# Altium footprint library 2.50-TO直插元件封装.PcbLib: 63 footprints (part 3 of 4)
Each footprint in its own frame and in the unit in brackets; x right, y up, seen from the top. Pads: shape width x height; smd on the part's side, far side on the other; paste and mask are expansions set on the pad; w line width, h text height; cw(c..) or ccw(c..) is an arc to the next point about the centre after c.
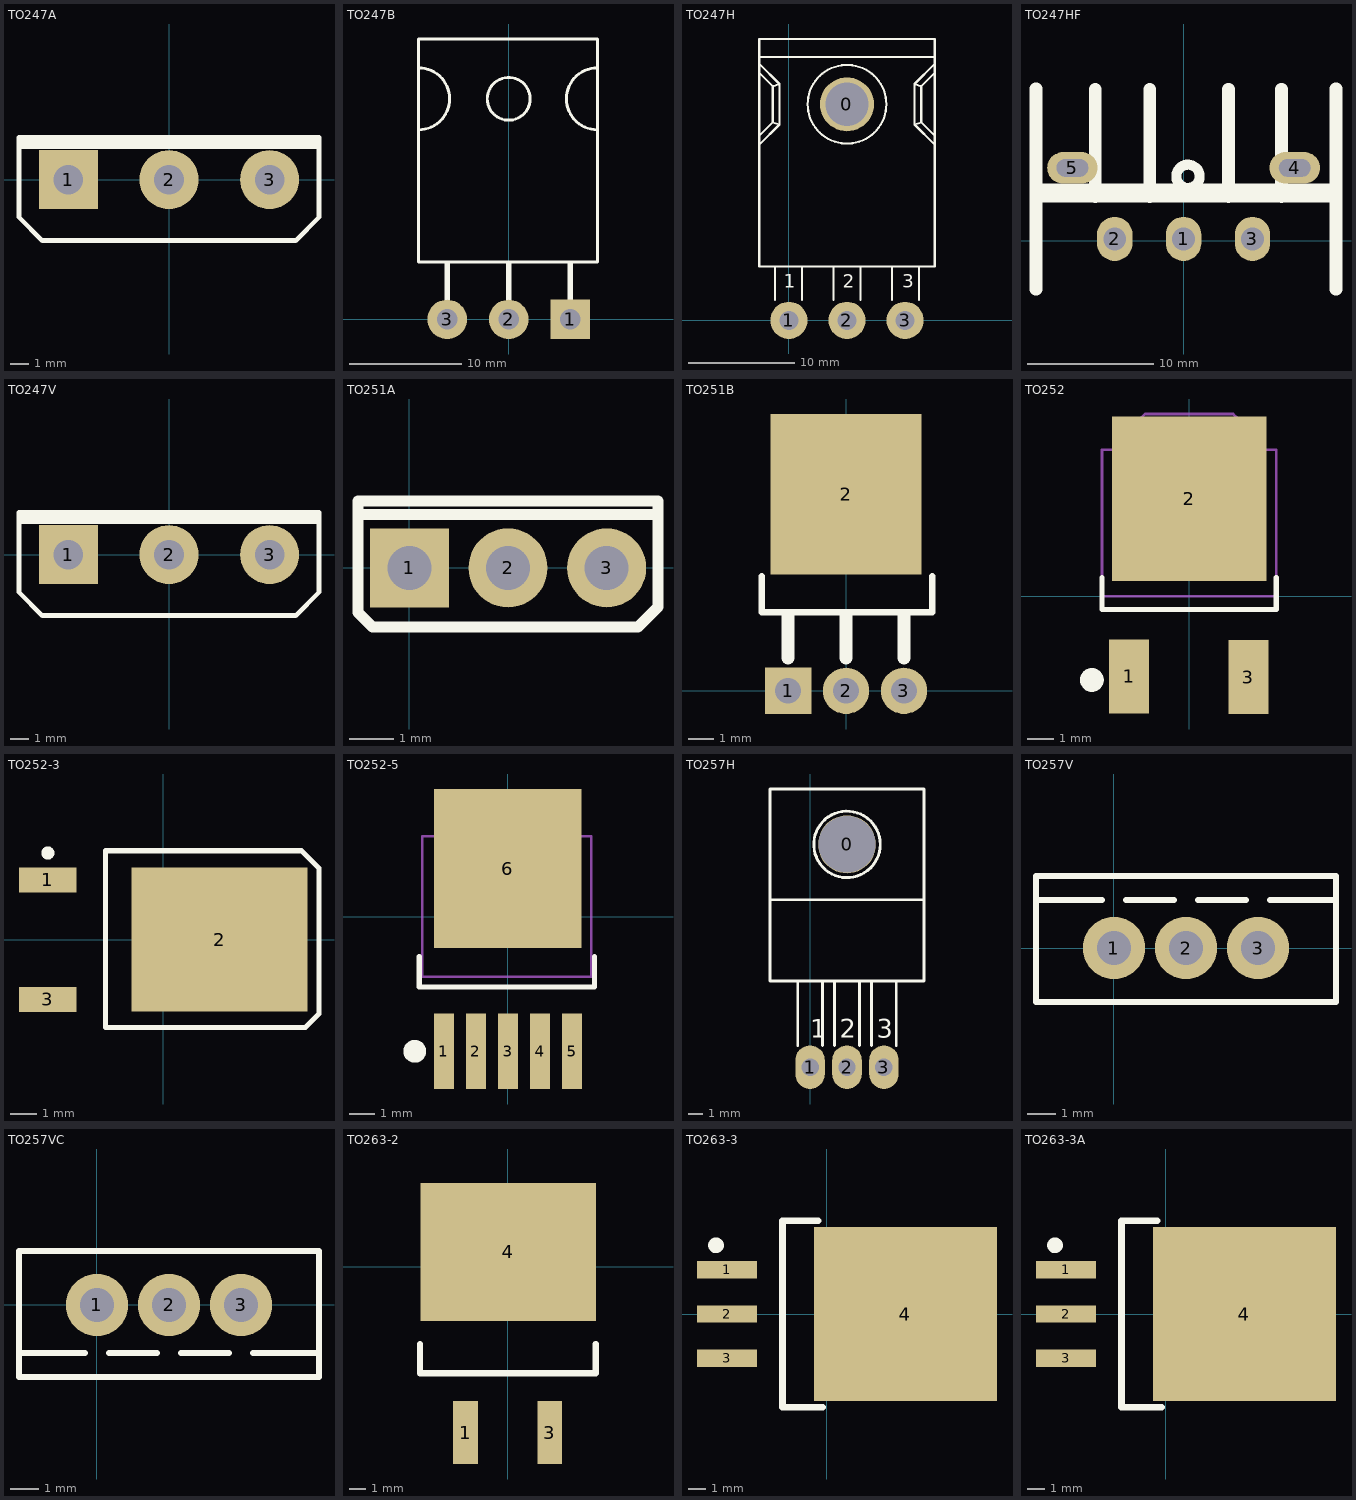
[diagram p2: the footprints below, top view; thin cyan lines are the x and y axes]

## TO247A [mm] "247，3脚立式封装"
pads (3):
  rect 3.2x3.2 hole 1.6: 1(-5.45,0)
  round 3.2 hole 1.6: 2(0,0) 3(5.45,0)
Top Overlay:
  lines w0.254: -8.128,1.778 -8.128,2.032 ; -8.128,1.778 -8.128,-2.032 -6.858,-3.302 6.858,-3.302 8.128,-2.032 8.128,1.778 ; -8.128,1.778 8.128,1.778 ; -8.128,2.032 -8.128,2.286 8.128,2.286 8.128,1.778 ; -8.128,2.032 8.128,2.032 8.128,1.778
3D body: height 24, standoff -6, extent -7.75,-3 7.75,2

## TO247B [mm] "247，3脚卧式封装"
pads (3):
  rect 3.5x3.5 hole 1.8: 1(5.461,0)
  round 3.5 hole 1.8: 2(0,0) 3(-5.461,0)
Top Overlay:
  circle w0.254: c0,19.58 r1.9
  lines w0.254: -8.001,16.83 ccw(c-8.001,19.58) -8.001,22.33 ; 7.874,16.83 cw(c7.874,19.58) 7.874,22.33 ; -8.001,5.08 7.874,5.08 7.874,24.892 -8.001,24.892 -8.001,5.08
  lines w0.508: -5.461,1.397 -5.461,4.953 ; 0,1.397 0,4.953 ; 5.461,1.397 5.461,4.953
3D body: height 3.49, standoff -5.51, extent -7.75,-0.35 7.75,25

## TO247H [mm] "封装库来自淘宝卖家 ID：黄晶宝石"
pads (4):
  round 5.08 hole 4.064: 0(5.461,20.32)
  round 3.5 hole 1.8: 1(0,0) 2(5.461,0) 3(10.922,0)
Top Overlay:
  circle w0.2: c5.461,20.32 r3.698
  lines w0.2: -2.794,16.51 -0.889,18.415 ; -2.794,17.357 -1.524,18.627 ; -2.794,23.283 -1.524,22.013 ; -2.794,24.13 -0.889,22.225 ; -2.794,24.765 13.716,24.765 ; -1.312,1.905 -1.312,5.08 ; 1.228,1.905 1.228,5.08 ; 4.191,1.905 4.191,5.08 ; 6.731,1.905 6.731,5.08 ; 9.694,1.905 9.694,5.08 ; 12.234,1.905 12.234,5.08 ; 13.716,16.51 11.811,18.415 ; 13.716,17.357 12.446,18.627 ; 13.716,23.283 12.446,22.013 ; 13.716,24.13 11.811,22.225 ; -1.524,18.627 -1.524,22.013 ; -1.524,18.627 -0.889,18.415 ; -1.524,22.013 -0.889,22.225 ; -0.889,18.415 -0.889,22.225 ; 11.811,18.415 11.811,22.225 ; 11.811,18.415 12.446,18.627 ; 11.811,22.225 12.446,22.013 ; 12.446,18.627 12.446,22.013 ; -2.794,5.08 13.716,5.08 13.716,26.458 -2.794,26.458 -2.794,5.08
  text "1" at -0.508,3.048 h1.27
  text "2" at 5.08,3.048 h1.27
  text "3" at 10.668,3.048 h1.27
3D body: height 5, standoff -4, extent -2.289,-0.096 13.211,25.254

## TO247HF [mm] "封装库来自淘宝卖家 ID：黄晶宝石"
pads (5):
  oval 2.8x3.5 hole 1.8: 1(0,0.127) 2(-5.45,0.127) 3(5.45,0.127)
  oval 4x2.5 hole 1.4 slot 2.5 at 0 deg: 4(8.8,5.75) 5(-8.8,5.75)
Top Overlay:
  circle w0.8: c0.345,5.08 r0.925
  lines w1: -11.684,-3.849 -11.684,12.006 ; -6.985,3.486 -6.985,11.986 ; -2.667,3.486 -2.667,11.986 ; 3.556,3.486 3.556,11.986 ; 7.747,3.486 7.747,11.986 ; 12.065,-3.849 12.065,12.006
  lines w1.5: -11.43,3.75 11.43,3.75
3D body: height 24, standoff -6, extent -7.75,-2.873 7.75,2.127

## TO247V [mm] "247，3脚立式封装  封装库来自淘宝卖家 ID：黄晶宝石"
pads (3):
  rect 3.2x3.2 hole 1.6: 1(-5.45,0)
  round 3.2 hole 1.6: 2(0,0) 3(5.45,0)
Top Overlay:
  lines w0.254: -8.128,1.778 8.128,1.778 ; -8.128,1.778 -8.128,-2.032 -6.858,-3.302 6.858,-3.302 8.128,-2.032 8.128,1.778 ; -8.128,1.778 -8.128,2.032 ; -8.128,2.032 8.128,2.032 8.128,1.778 ; -8.128,2.032 -8.128,2.286 8.128,2.286 8.128,1.778
3D body: height 24, standoff -6, extent -7.75,-3 7.75,2

## TO251A [mm] "251，3脚晶体管  封装库来自淘宝卖家 ID：黄晶宝石"
height 0.9
pads (3):
  rect 1.8x1.8 hole 1: 1(0,0)
  round 1.8 hole 1: 2(2.248,0) 3(4.496,0)
Top Overlay:
  lines w0.254: -1.168,1.219 5.639,1.219 ; -1.168,-1.016 -1.168,1.524 5.664,1.524 5.664,-0.889 5.207,-1.346 -0.838,-1.346 -1.168,-1.016
3D body: height 9.91, standoff -5, extent -1.052,-1.05 5.548,1.25

## TO251B [mm] "251，3脚晶体管"
height 0.9
pads (4):
  rect 1.8x1.8 hole 1: 1(-2.248,0)
  round 1.8 hole 1: 2(0,0) 3(2.248,0)
  rect 5.842x6.223 smd: 2(0,7.62)
Top Overlay:
  lines w0.254: -3.264,4.445 -3.264,3.048 3.34,3.048 3.34,4.445
  lines w0.508: -2.248,1.27 -2.248,2.921 ; 0,1.27 0,2.921 ; 2.248,1.27 2.248,2.921
3D body: height 2.3, standoff -3, extent -3.3,-0.25 3.3,9.912

## TO252 [mil] "252晶体管"
pads (3):
  rect 60x110 smd: 1(-89.55,-119.77) 3(88.45,-120.77)
  rect 230x245 smd: 2(0,145.35)
Top Overlay:
  circle w19.68: c-145,-125 r7.87
  lines w7.87: -130,27.56 -130,-20 130,-20 130,27.56
Mechanical 15:
  lines w3.94: -105.04,218.5 -105.04,236.06 -65.59,271.65 65.59,271.65 105.04,236.06 105.04,218.5 ; -130,0 130,0 130,218.5 -130,218.5 -130,0
3D body: height 98.31, standoff 3.82, extent -132.55,-155.08 132.56,242.56

## TO252-3 [mm] "D-PAK  / SOT-428  封装库来自淘宝卖家 ID：黄晶宝石"
height 2.38
pads (3):
  rect 2.2x0.95 smd: 1(-4.4,2.28) 3(-4.4,-2.28)
  rect 6.7x5.5 smd: 2(2.15,0)
Top Overlay:
  circle w0.25: c-4.4,3.305 r0.125
  lines w0.1: -2.2,-3.35 -2.2,3.35
  lines w0.2: -2.2,-3.35 5.418,-3.35 5.944,-2.824 5.944,2.725 5.278,3.391 -2.2,3.391 -2.2,-3.35
3D body: height 2.5, standoff 0.1, extent -5.08,-3.367 5.02,3.367

## TO252-5 [mm] "TO252-5"
pads (6):
  rect 0.8x3 smd: 1(-2.529,-5.328) 2(-1.259,-5.328) 3(0.011,-5.328) 4(1.281,-5.328) 5(2.551,-5.328)
  rect 5.842x6.3 smd: 6(0,1.905)
Top Overlay:
  circle w0.5: c-3.683,-5.334 r0.2
  lines w0.2: -3.504,-1.586 -3.504,-2.794 3.429,-2.794 3.429,-1.586
Mechanical 15:
  lines w0.1: -2.668,3.222 -2.668,3.668 -1.666,4.572 1.666,4.572 2.668,3.668 2.668,3.222 ; -3.377,-2.375 3.302,-2.375 3.302,3.175 -3.377,3.175 -3.377,-2.375
3D body: height 2.3, standoff 0, extent -3.35,-5.964 3.35,4.05

## TO257H [mm] "封装库来自淘宝卖家 ID：黄晶宝石"
pads (4):
  oval 3.937x4 hole 3.9: 0(2.54,18.627)
  oval 2.032x3 hole 1.2: 1(0,3.302) 2(2.54,3.302) 3(5.08,3.302)
Top Overlay:
  circle w0.203: c2.54,18.627 r2.286
  lines w0.2: -2.752,14.817 7.832,14.817 ; -0.847,4.784 -0.847,9.229 ; 0.847,4.784 0.847,9.229 ; 1.693,4.784 1.693,9.229 ; 3.387,4.784 3.387,9.229 ; 4.233,4.784 4.233,9.229 ; 5.927,4.784 5.927,9.229 ; -2.752,9.229 7.832,9.229 7.832,22.437 -2.752,22.437 -2.752,9.229
  text "1" at 0,5.334 h1.27
  text "2" at 2.032,5.334 h1.27
  text "3" at 4.572,5.334 h1.27
3D body: height 4.5, standoff -3.43, extent -2.61,3.302 7.69,22.052

## TO257V [mm] "封装库来自淘宝卖家 ID：黄晶宝石"
pads (3):
  round 2.2 hole 1.2: 1(0,0) 2(2.54,0) 3(5.08,0)
Top Overlay:
  lines w0.2: -2.752,1.693 -0.423,1.693 ; 0.423,1.693 2.117,1.693 ; 2.963,1.693 4.657,1.693 ; 5.503,1.693 7.832,1.693 ; -2.752,-1.905 -2.752,2.54 7.832,2.54 7.832,-1.905 -2.752,-1.905
3D body: height 3.5, standoff -19, extent -2.61,-1.53 7.69,2.9

## TO257VC [mm]
pads (3):
  round 2.2 hole 1.2: 1(0,0) 2(2.54,0) 3(5.08,0)
Top Overlay:
  lines w0.2: -2.752,-1.693 -0.423,-1.693 ; 0.423,-1.693 2.117,-1.693 ; 2.963,-1.693 4.657,-1.693 ; 5.503,-1.693 7.832,-1.693 ; -2.752,-2.54 -2.752,1.905 7.832,1.905 7.832,-2.54 -2.752,-2.54
3D body: height 3.5, standoff -19, extent -2.61,-2.9 7.69,1.53

## TO263-2 [mil] "封装库来自淘宝卖家 ID：黄晶宝石"
pads (3):
  rect 59.06x150 smd: 1(-101,-397) 3(100,-397)
  rect 420x330 smd: 4(1,35)
Top Overlay:
  lines w15: -210,-185 -210,-255 210,-255 210,-185
3D body: height 200.2, standoff 2.64, extent -199.99,-425.71 200.01,175.23

## TO263-3 [mm] "263，3脚晶体管"
height 4.5
pads (4):
  rect 3.45x1 smd: 1(-5.717,2.54) 2(-5.717,0) 3(-5.717,-2.54)
  rect 10.5x10 smd: 4(4.5,0)
Top Overlay:
  circle w0.5: c-6.35,3.937 r0.2
  lines w0.381: -0.508,5.334 -2.54,5.334 -2.54,-5.334 -0.254,-5.334
3D body: height -0.46, standoff -5.16, extent -6.325,-4.953 8.103,5.047

## TO263-3A [mm] "263，3脚晶体管"
height 4.5
pads (4):
  rect 3.45x1 smd: 1(-5.717,2.54) 2(-5.717,0) 3(-5.717,-2.54)
  rect 10.5x10 smd: 4(4.5,0)
Top Overlay:
  circle w0.5: c-6.35,3.937 r0.2
  lines w0.381: -0.508,5.334 -2.54,5.334 -2.54,-5.334 -0.254,-5.334
3D body: height -0.46, standoff -5.16, extent -6.325,-4.953 8.103,5.047